# Altium footprint library S61.PcbLib: 50 footprints (part 4 of 4)
Each footprint in its own frame and in the unit in brackets; x right, y up, seen from the top. Pads: shape width x height; smd on the part's side, far side on the other; paste and mask are expansions set on the pad; w line width, h text height; cw(c..) or ccw(c..) is an arc to the next point about the centre after c.
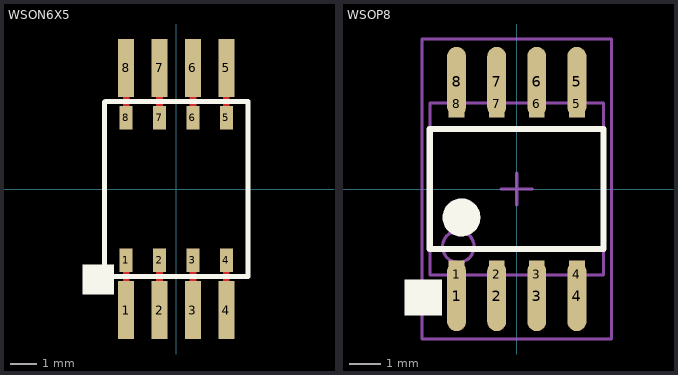
[diagram p3: the footprints below, top view; thin cyan lines are the x and y axes]

## WSON6X5 [mm]
pads (16):
  rect 0.6x2.2 smd: 1(-1.905,-4.6) 2(-0.635,-4.6) 3(0.635,-4.6) 4(1.905,-4.6) 5(1.905,4.6) 6(0.635,4.6) 7(-0.635,4.6) 8(-1.905,4.6)
  rect 0.5x0.889 smd: 1(-1.905,-2.701) 2(-0.635,-2.701) 3(0.635,-2.701) 4(1.905,-2.701) 5(1.905,2.701) 6(0.635,2.701) 7(-0.635,2.701) 8(-1.905,2.701)
Top Layer:
  lines w0.254: -1.905,-4.6 -1.905,-2.625 ; -1.905,2.625 -1.905,2.701 -1.905,4.6 ; -0.635,-4.6 -0.635,-2.701 -0.635,-2.625 ; -0.635,2.625 -0.635,2.701 -0.635,4.6 ; 0.635,-4.6 0.635,-2.701 0.635,-2.625 ; 0.635,2.625 0.635,4.6 ; 1.905,-4.6 1.905,-2.701 1.905,-2.625 ; 1.905,2.625 1.905,4.6
Top Overlay:
  rectangle: -3.556,-4.013 -2.362,-2.87
  lines w0.2: -2.725,-3.327 2.725,-3.327 2.725,3.251 ; -2.725,-3.251 -2.725,1.168 ; -2.725,0.635 -2.725,3.295 -2.692,3.327 2.725,3.327

## WSOP8 [mm]
pads (16):
  oval 0.6x2.2 smd: 1(-1.905,-3.4) 2(-0.635,-3.4) 3(0.635,-3.4) 4(1.905,-3.4) 5(1.905,3.4) 6(0.635,3.4) 7(-0.635,3.4) 8(-1.905,3.4)
  rect 0.5x0.889 smd: 1(-1.905,-2.701) 2(-0.635,-2.701) 3(0.635,-2.701) 4(1.905,-2.701) 5(1.905,2.701) 6(0.635,2.701) 7(-0.635,2.701) 8(-1.905,2.701)
Top Layer:
  lines w0.254: -1.905,2.625 -1.905,2.701 ; -0.635,-2.701 -0.635,-2.625 ; -0.635,2.625 -0.635,2.701 ; 0.635,-2.701 0.635,-2.625 ; 1.905,-2.701 1.905,-2.625
Top Overlay:
  circle w0.6: c-1.75,-0.9 r0.3
  circle w0.25: c-2.755,-3.4 r0.125
  rectangle: -3.556,-4.013 -2.362,-2.87
  lines w0.2: -2.75,-1.9 -2.75,1.9 2.75,1.9 2.75,-1.9 -2.75,-1.9
Mechanical 13:
  circle w0.1: c-1.85,-1.825 r0.5
  lines w0.1: -2.75,-2.725 -2.75,2.725 2.75,2.725 2.75,-2.725 -2.75,-2.725
Mechanical 15:
  lines w0.1: -0.5,0 0.5,0 ; 0,-0.5 0,0.5 ; -3,-4.75 -3,4.75 3,4.75 3,-4.75 -3,-4.75
3D body: height 2.13, standoff 0, extent -2.75,-2.725 2.75,2.725